# Altium footprint library MyPcbLib.PcbLib: 237 footprints (part 6 of 15)
Each footprint in its own frame and in the unit in brackets; x right, y up, seen from the top. Pads: shape width x height; smd on the part's side, far side on the other; paste and mask are expansions set on the pad; w line width, h text height; cw(c..) or ccw(c..) is an arc to the next point about the centre after c.
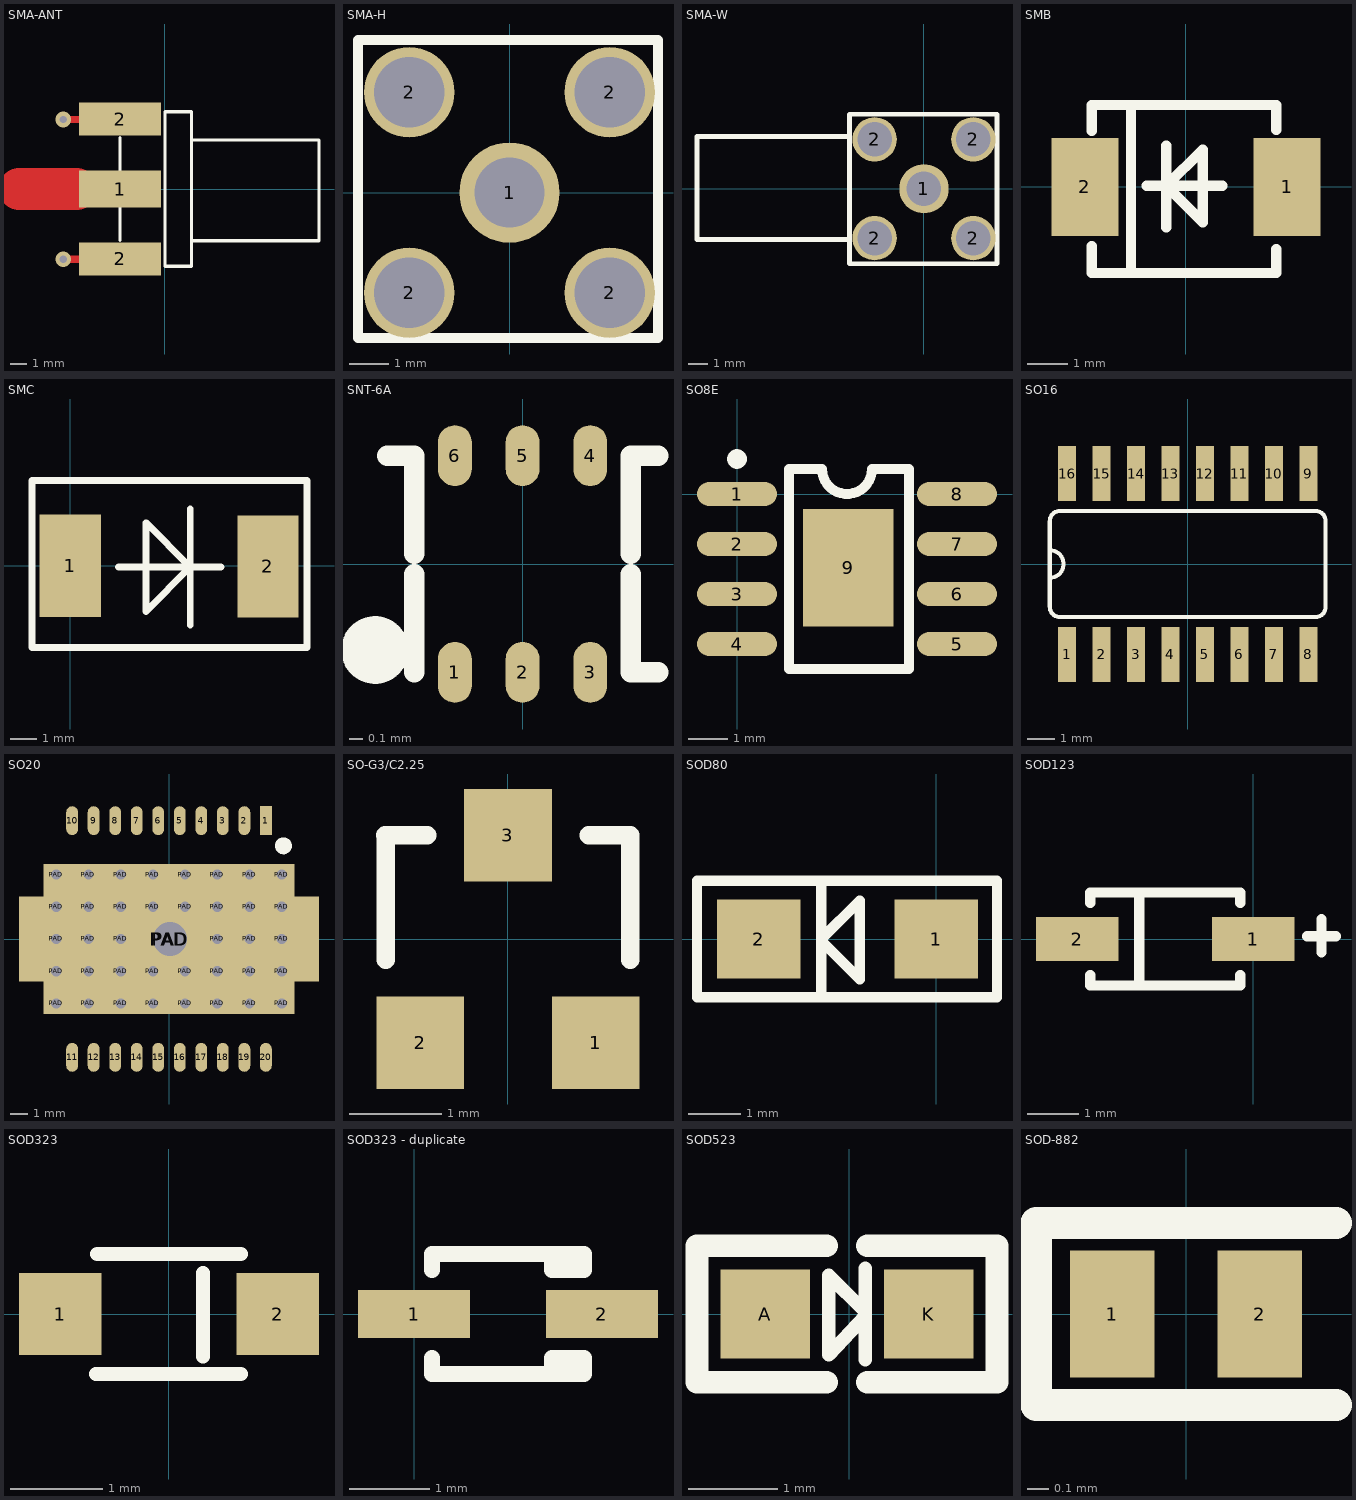
[diagram p5: the footprints below, top view; thin cyan lines are the x and y axes]

## SMA-ANT [mil] "142-0701-801/806"
pads (3):
  rect 200x90 smd: 1(-109,0)
  rect 200x80 all layers, no hole: 2(-109,-170) 2(-109,170)
via -247,-171 diameter 38 hole 18
via -247,169 diameter 38 hole 18
Top Layer:
  lines w18: -248,169 -128,169 ; -247,-171 -99,-171
  lines w103: -355,0 -216,0
Top Overlay:
  lines w7.87: -109,-125 -109,125 ; 68,-126 375,-126 375,119 68,119 ; 0,-188 0,188 65,188 65,-188 0,-188
3D body "SMA - 50 Ohm Connectors 142-0701-801.step": height 175.51, standoff -136.3, extent -190.91,-186 370.9,188.8

## SMA-H [mil]
pads (5):
  round 100 hole 70: 1(0,0)
  round 90 hole 70: 2(-100,-100) 2(-100,100) 2(100,-100) 2(100,100)
Top Overlay:
  lines w10: -151,-145 -151,152 148,152 148,-145 -151,-145
3D body "SMA-H.stp": height 105.71, standoff -430.31, extent -124.21,-124.2 124.21,124.22

## SMA-W [mil]
pads (5):
  round 100 hole 70: 1(0,0)
  round 90 hole 70: 2(-100,-100) 2(-100,100) 2(100,-100) 2(100,100)
Top Overlay:
  lines w10: -152,-103 -460,-103 -460,106 -151,106 ; -151,-152 -151,151 148,151 148,-152 -151,-152
3D body "Samtec-SMA-J-P-H-RA-TH1.step": height 108.06, standoff -447.24, extent -459.69,-139.8 134.8,135.79

## SMB [mm] "DO-214AA"
pads (2):
  rect 1.65x2.4 smd: 1(2.475,0) 2(-2.475,0)
Top Overlay:
  lines w0.254: -2.311,-1.448 -2.311,-2.108 2.21,-2.108 2.21,-1.524 ; -2.311,1.372 -2.311,2.007 2.21,2.007 2.21,1.397 ; -1.346,-2.032 -1.346,2.007 ; -0.965,0.025 0.889,0.025 ; -0.483,-0.991 -0.483,1.016 ; -0.483,0.025 0.406,-0.864 0.406,0.914 -0.483,0.025
3D body "DI-214AA(SMB).step": height 2.45, standoff 0.03, extent -2.75,-1.975 2.75,1.925

## SMC [mil] "DO-214AB(2114)"
pads (2):
  rect 90x149.84 smd: 1(0,0)
  rect 90x149.63 smd: 2(290,-1)
Top Overlay:
  lines w10: 71,-2 221,-2 ; 176,-87 176,83 ; -56,-120 347,-120 347,125 -56,125 -56,-120 ; 111,-67 111,63 176,-2 111,-67
3D body "DO-214AB.STEP": height 106.3, standoff 0, extent -14.84,-117.09 304.84,127

## SNT-6A [mm]
height 0.5
pads (6):
  oval 0.25x0.45 smd: 1(-0.5,-0.8) 2(0,-0.8) 3(0.5,-0.8) 4(0.5,0.8) 5(0,0.8) 6(-0.5,0.8)
Top Overlay:
  circle w0.25: c-1.09,-0.635 r0.125
  lines w0.152: -1,0.8 -0.8,0.8 -0.8,0.075 ; -0.8,-0.8 -0.8,-0.075 ; 0.8,-0.075 0.8,-0.8 1,-0.8 ; 0.8,0.075 0.8,0.8 1,0.8
3D body "SNT-6A.STEP": height 0.5, standoff 0, extent -0.799,-0.898 0.799,0.9

## SO8E [mil]
pads (9):
  oval 80x24 smd: 1(0,0) 2(0,-50) 3(0,-100) 4(0,-150) 5(220,-150) 6(220,-100) 7(220,-50) 8(220,0)
  rect 90.55x117.72 smd: 9(111.23,-73.8)
Top Overlay:
  circle w9.84: c0,35 r4.92
  lines w10: 52,-175 172,-175 172,25 135,25 cw(c110,25) 85,25 52,25 52,-175
3D body "SOP8.STEP": height 62.99, standoff 0, extent -7.7,-172.62 230.17,25.02

## SO16 [mil]
pads (16):
  rect 26x80 smd: 1(-175,-131) 2(-125,-131) 3(-75,-131) 4(-25,-131) 5(25,-131) 6(75,-131) 7(125,-131) 8(175,-131) 9(175,131) 10(125,131) 11(75,131) 12(25,131) 13(-25,131) 14(-75,131) 15(-125,131) 16(-175,131)
Top Overlay:
  lines w6: -200,-20 ccw(c-200,0) -200,20 ; -200,-20 -200,20 ; -200,-20 -200,-62 ccw(c-185,-62) -185,-77 185,-77 ccw(c185,-62) 200,-62 200,62 ccw(c185,62) 185,77 -185,77 ccw(c-185,62) -200,62 -200,20
3D body "User Library-SOP16_208mil (5_3mm).STEP": height 70.87, standoff -7.87, extent -200.78,-155.93 200.79,155.92

## SO20 [mm]
pads (63):
  rect 0.7x1.7 smd mask+0.07: 1(5.715,6.985)
  oval 0.7x1.7 smd mask+0.07: 2(4.445,6.985) 3(3.175,6.985) 4(1.905,6.985) 5(0.635,6.985) 6(-0.635,6.985) 7(-1.905,6.985) 8(-3.175,6.985) 9(-4.445,6.985) 10(-5.715,6.985) 11(-5.715,-6.985) 12(-4.445,-6.985) 13(-3.175,-6.985) 14(-1.905,-6.985) 15(-0.635,-6.985) 16(0.635,-6.985) 17(1.905,-6.985) 18(3.175,-6.985) 19(4.445,-6.985) 20(5.715,-6.985)
  round 0.9 hole 0.6 mask+0.06: PAD(-6.65,-3.8) PAD(-6.65,-1.9) PAD(-6.65,0) PAD(-6.65,1.9) PAD(-6.65,3.8) PAD(-4.75,-3.8) PAD(-4.75,-1.9) PAD(-4.75,0) PAD(-4.75,1.9) PAD(-4.75,3.8) PAD(-2.85,-3.8) PAD(-2.85,-1.9) PAD(-2.85,0) PAD(-2.85,1.9) PAD(-2.85,3.8) PAD(-0.95,-3.8) PAD(-0.95,-1.9) PAD(-0.95,1.9) PAD(-0.95,3.8) PAD(0.95,-3.8) PAD(0.95,-1.9) PAD(0.95,1.9) PAD(0.95,3.8) PAD(2.85,-3.8) PAD(2.85,-1.9) PAD(2.85,0) PAD(2.85,1.9) PAD(2.85,3.8) PAD(4.75,-3.8) PAD(4.75,-1.9) PAD(4.75,0) PAD(4.75,1.9) PAD(4.75,3.8) PAD(6.65,-3.8) PAD(6.65,-1.9) PAD(6.65,0) PAD(6.65,1.9) PAD(6.65,3.8)
  rect 17.7x5 smd mask+0.06: PAD(0,0)
  rect 17.7x3 smd mask+0.06: PAD(0,0)
  rect 9.8x6.2 smd mask+0.06: PAD(0,0)
  rect 14.8x8.828 smd mask+0.06: PAD(0,0)
  round 2.5 hole 2 mask+0.06: PAD(0.069,0)
Top Overlay:
  circle w0.5: c6.75,5.5 r0.25
3D body "User Library-PowerSO20.STEP": height 3.6, standoff 0, extent -8,-7.2 8,7.2

## SO-G3/C2.25 [mm] "SOT-23; 3 Leads; Body 3.0 x 2.5 mm, inc. leads (LxW max)"
height 1.2
pads (3):
  rect 0.95x1 smd: 1(0.95,-1.125) 2(-0.95,-1.125) 3(0,1.125)
Top Overlay:
  lines w0.2: -1.328,1.125 -0.875,1.125 ; -1.325,-0.225 -1.325,1.125 ; 0.875,1.125 1.325,1.125 1.325,-0.225
3D body "SOT-23.STEP": height 1.11, standoff 0.01, extent -1.503,-1.26 1.498,1.24

## SOD80 [mm] "LL34"
pads (2):
  rect 1.6x1.524 smd: 1(0,0) 2(-3.4,0)
Top Overlay:
  lines w0.2: -4.588,1.092 -4.588,-1.118 1.168,-1.118 1.168,1.067 ; -4.588,1.118 1.168,1.118 ; -2.2,-1.118 -2.2,1.118 ; -2.2,-0.035 -1.463,-0.772 -1.463,0.737 -2.2,0 -2.2,-0.035
3D body "SOD-80.STEP": height 1.5, standoff 0, extent -3.528,-0.75 -0.028,0.75

## SOD123 [mm] "1206"
pads (2):
  rect 1.6x0.85 smd: 1(0,0) 2(-3.4,0)
Top Overlay:
  lines w0.2: -3.15,-0.7 -3.15,-0.9 -0.25,-0.9 -0.25,-0.7 ; -3.15,0.7 -3.15,0.9 -0.25,0.9 -0.25,0.7 ; -2.2,-0.9 -2.2,0.9 ; 1.043,0.051 1.602,0.051 ; 1.323,-0.254 1.323,0.381
3D body "User Library-SOD-123_DiodesInc.STEP": height 1.42, standoff -0.03, extent -3.596,-0.853 0.254,0.847

## SOD323 [mil] "SODFL, 2-Leads, Body 1.30x2.60mm, IPC Medium Density"
height 39.37
pads (2):
  rect 35x35 smd: 1(-46.26,0) 2(46.26,0)
Top Overlay:
  lines w6: -31,-25.5 30.5,-25.5 ; -30.5,25.5 30.5,25.5 ; 14.44,-18 14.44,17.5
3D body "SOD323.step": height 39.37, standoff 0, extent -51.18,-27.56 51.18,27.56

## SOD323 - duplicate [mm] "0805"
pads (2):
  rect 1.4x0.6 smd: 1(0,0) 2(2.35,0)
Top Overlay:
  lines w0.2: 0.225,-0.55 0.225,-0.75 2.125,-0.75 2.125,-0.55 1.725,-0.55 1.725,-0.75 ; 0.225,0.55 0.225,0.75 2.125,0.75 2.125,0.55 1.725,0.55 1.725,0.75
3D body "SOD-323.STEP": height 1, standoff 0, extent -0.169,-0.667 2.431,0.633

## SOD523 [mm] "0603"
pads (2):
  rect 1x1 smd: A(-0.94,0) K(0.889,0)
Top Overlay:
  lines w0.152: 0.178,-0.508 0.178,0.508 ; 0.178,-0.025 -0.229,-0.457 -0.229,0.432 0.178,0.025
  lines w0.254: -0.254,-0.762 -1.702,-0.762 -1.702,0.762 -0.254,0.762 ; 0.203,-0.762 1.651,-0.762 1.651,0.762 0.203,0.762
3D body "SOD-523.STEP": height 0.65, standoff 0, extent -0.813,-0.381 0.787,0.419

## SOD-882 [mm]
height 0.5
pads (2):
  rect 0.4x0.6 smd: 1(-0.35,0) 2(0.35,0)
Top Overlay:
  lines w0.152: 0.711,-0.432 -0.711,-0.432 -0.711,0.432 0.711,0.432
3D body "SOD-882.STEP": height 0.5, standoff 0, extent -0.52,-0.32 0.52,0.32